# Altium footprint library TomvanRijn-PCB.PcbLib: 165 footprints (part 10 of 11)
Each footprint in its own frame and in the unit in brackets; x right, y up, seen from the top. Pads: shape width x height; smd on the part's side, far side on the other; paste and mask are expansions set on the pad; w line width, h text height; cw(c..) or ccw(c..) is an arc to the next point about the centre after c.
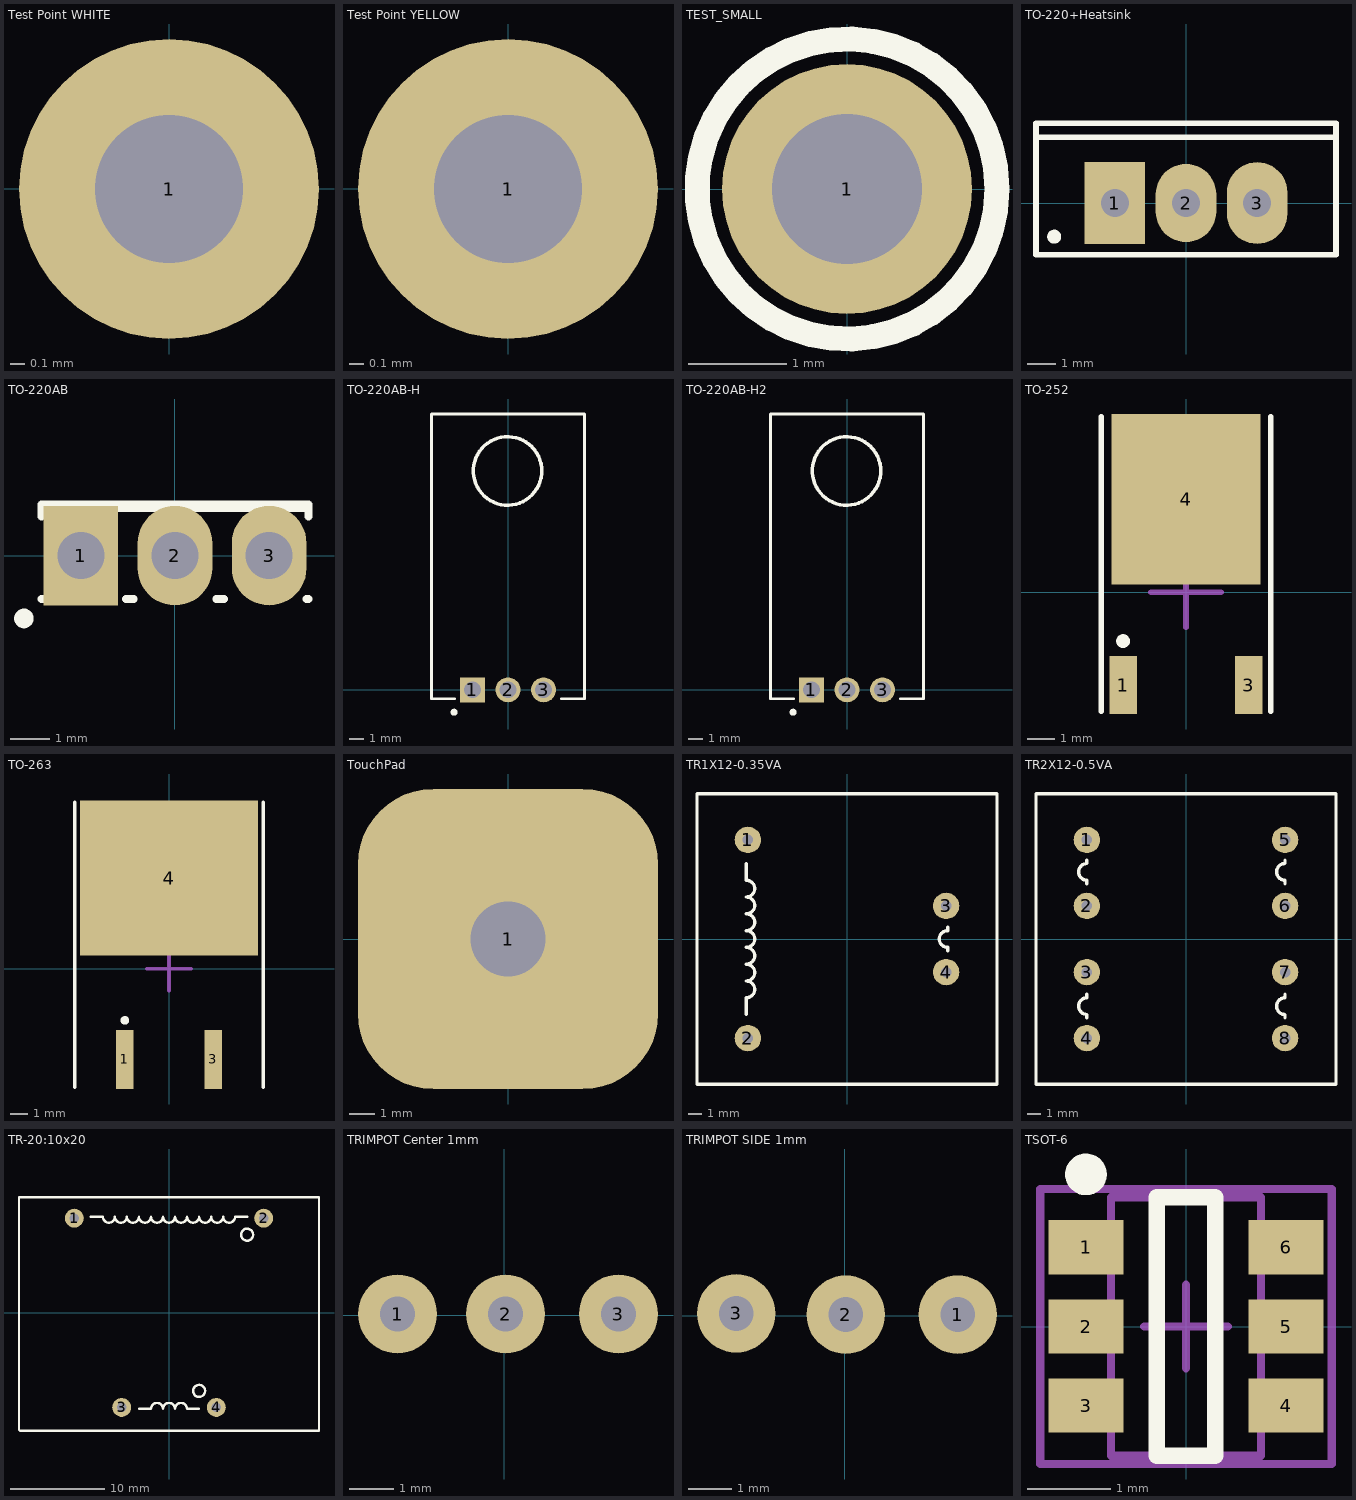
[diagram p9: the footprints below, top view; thin cyan lines are the x and y axes]

## Test Point WHITE [mil] "Test Point Keystone WHITE 5002"
pads (1):
  round 80 hole 39.37: 1(0,0)
3D body "User Library-TEST POINT WHT Keystone 5002.step": height 192.34, standoff -121.02, extent -50,-50 50,50

## Test Point YELLOW [mil] "Test Point Keystone YELLOW 5004"
pads (1):
  round 80 hole 39.37: 1(0,0)
3D body "User Library-TEST POINT YEL Keystone 5004.step": height 192.34, standoff -121.02, extent -50,-50 50,50

## TEST_SMALL [mil] "Test Point"
pads (1):
  round 100 hole 60: 1(0,0)
Top Overlay:
  circle w10: c0,0 r60

## TO-220+Heatsink [mil] "TO, Thru-Hole, Vertical, Heatsink Mounted; 3 In-Line Leads; Pitch 2.54 mm"
height 759.84
pads (3):
  rect 85x115 hole 39.37: 1(-100,0)
  oval 85x110 hole 39.37: 2(0,0)
  oval 85x115 hole 39.37: 3(100,0)
Top Overlay:
  circle w9.84: c-185.04,-47.24 r4.92
  lines w7.87: -210.63,92.52 210.63,92.52 ; -210.63,-72.83 -210.63,112.2 210.63,112.2 210.63,-72.83 -210.63,-72.83
Mechanical 13:
  lines w3.94: -210.63,-72.83 210.63,-72.83 210.63,112.2 -210.63,112.2 -210.63,-72.83
Mechanical 15:
  lines w3.94: -19.69,0 19.68,0 ; 0,-19.69 0,19.68
3D body "User Library-TO3B_(TO220)_1.step": height 948.03, standoff -170.08, extent -204.72,-67.16 204.72,110
3D body "User Library-heatsink-2.STEP": height 1075, standoff -66.73, extent -492.12,-135.28 492.13,455.27

## TO-220AB [mm] "TO-220AB, 3 leads, 2.40 mm pitch"
height 9.7
pads (3):
  rect 1.905x2.54 hole 1.2: 1(-2.4,0)
  oval 1.905x2.54 hole 1.2: 2(0,0) 3(2.4,0)
Top Overlay:
  circle w0.25: c-3.85,-1.6 r0.125
  lines w0.2: -3.4,-1.1 -3.35,-1.1 ; -3.4,1 -3.4,1.3 3.4,1.3 3.4,1 ; -3.4,1.21 3.4,1.21 ; -1.25,-1.1 -1.05,-1.1 ; 1.05,-1.1 1.25,-1.1 ; 3.35,-1.1 3.4,-1.1
Mechanical 15:
  lines w0.1: -0.5,0 0.5,0 ; 0,-0.5 0,0.5
3D body "TO-220AB.step": height 19.33, standoff -10, extent -5.466,-1.495 5.747,3.195

## TO-220AB-H [mil] "TO-220AB, 3 leads, 100 mil pitch, horizontal"
height 157.48
pads (3):
  rect 70x70 hole 47.24: 1(-100,0)
  round 70 hole 47.24: 2(0,0) 3(100,0)
Top Overlay:
  circle w9.84: c-151.57,-62.99 r4.92
  circle w10: c-1.18,615 r96.18
  lines w8: -150,-25 -215,-25 -215,775 215,775 215,-25 150,-25
Mechanical 15:
  lines w3.94: -19.69,0 19.68,0 ; 0,-19.68 0,19.69
3D body "TO-220-H.step": height 165.35, standoff -118.11, extent -199.99,-9.84 200.01,757.49

## TO-220AB-H2 [mil] "TO-220AB, 3 leads, 100 mil pitch, horizontal"
height 354.33
pads (3):
  rect 70x70 hole 47.24: 1(-100,0)
  round 70 hole 47.24: 2(0,0) 3(100,0)
Top Overlay:
  circle w10: c-1.18,615 r96.18
  circle w9.84: c-151.57,-62.99 r4.92
  lines w8: -150,-25 -215,-25 -215,775 215,775 215,-25 150,-25
Mechanical 15:
  lines w3.94: -19.69,0 19.68,0 ; 0,-19.68 0,19.69
3D body: height 196.85, standoff -118.11, extent 88.29,-11.78 111.82,11.8
3D body: height 196.85, standoff -118.11, extent -11.71,-11.78 11.82,11.8
3D body: height 196.85, standoff -118.11, extent -111.71,-11.79 -88.18,11.79
3D body "TO-220-H.step": height 342.52, standoff 59.06, extent -199.99,-9.84 200.01,757.49

## TO-252 [mm] "D-PAK/TO-252-AA; 3 Leads (1 Cropped); Body 10.1 (inc. leads) x 6.6 mm (LxW max)"
height 2.4
pads (3):
  rect 1x2.1 smd: 1(-2.285,-3.375) 3(2.285,-3.375)
  rect 5.4x6.2 smd: 4(0,3.375)
Top Overlay:
  circle w0.25: c-2.285,-1.775 r0.125
  lines w0.2: -3.085,-4.325 -3.085,6.375 ; 3.085,-4.325 3.085,6.375
Mechanical 15:
  lines w0.203: -1.27,0 1.27,0 ; 0,-1.27 0,1.27
3D body "TO-252.step": height 2.29, standoff -0.13, extent -3.27,-4.033 3.27,5.906

## TO-263 [mm] "D2-PAK/TO-263-AB; 3 Leads (1 Cropped); Body 15.9 (inc. leads) x 10.4 mm (LxW max)"
height 4.6
pads (3):
  rect 1x3.4 smd: 1(-2.54,-5.225) 3(2.54,-5.225)
  rect 10.25x8.9 smd: 4(0,5.225)
Top Overlay:
  circle w0.25: c-2.54,-2.975 r0.125
  lines w0.2: -5.425,-6.825 -5.425,9.575 ; 5.425,-6.825 5.425,9.575
Mechanical 15:
  lines w0.203: -1.27,0 1.27,0 ; 0,-1.27 0,1.27
3D body "TO-263.step": height 4.78, standoff -0.23, extent -5.08,-6.241 5.08,9.023

## TouchPad [mm] "Touch pad"
pads (2):
  rrect50% 12x12 smd paste-1000: 1(0,0)
  rect 0x0 hole 3: 13(0,0)

## TR1X12-0.35VA [mm] "Transformer 230V 1x12V 0.35VA primary pitch 15 mm, secondary pitch 5mm, spacing 15mm"
height 15
pads (4):
  round 2 hole 0.8: 1(-7.5,7.5) 2(-7.5,-7.5) 3(7.5,2.5) 4(7.5,-2.5)
Top Overlay:
  lines w0.254: -7.62,-5.715 -7.62,-4.445 ccw(c-7.62,-3.81) -7.62,-3.175 ccw(c-7.62,-2.54) -7.62,-1.905 ccw(c-7.62,-1.27) -7.62,-0.635 ccw(c-7.62,0) -7.62,0.635 ccw(c-7.62,1.27) -7.62,1.905 ccw(c-7.62,2.54) -7.62,3.175 ccw(c-7.62,3.81) -7.62,4.445 -7.62,5.715 ; 7.62,-0.889 7.62,-0.635 cw(c7.62,0) 7.62,0.635 7.62,0.889 ; -11.35,-11 11.35,-11 11.35,11 -11.35,11 -11.35,-11
3D body: height 2.08, standoff -3, extent 7.203,-2.799 7.8,-2.2
3D body: height 2.08, standoff -3, extent 7.202,2.201 7.8,2.8
3D body: height 2.08, standoff -3, extent -7.798,7.201 -7.2,7.8
3D body: height 2.08, standoff -3, extent -7.798,-7.799 -7.2,-7.2
3D body: height 11.5, standoff 0, extent -11.477,-11.127 11.477,11.127
3D body: height 15, standoff 0, extent -7.5,-7.5 7.493,7.5

## TR2X12-0.5VA [mm] "Transformer 230V 2x12V 0.5VA primary pitch 15 mm, secondary pitch 5mm, spacing 15mm"
height 19
pads (8):
  round 2 hole 0.8: 1(-7.5,7.5) 2(-7.5,2.5) 3(-7.5,-2.5) 4(-7.5,-7.5) 5(7.5,7.5) 6(7.5,2.5) 7(7.5,-2.5) 8(7.5,-7.5)
Top Overlay:
  lines w0.254: -7.5,-5.969 -7.5,-5.715 cw(c-7.493,-5.08) -7.5,-4.445 -7.5,-4.191 ; -7.5,4.191 -7.5,4.445 cw(c-7.493,5.08) -7.5,5.715 -7.5,5.962 ; 7.493,-5.969 7.493,-5.715 cw(c7.493,-5.08) 7.493,-4.445 7.493,-4.191 ; 7.493,4.191 7.493,4.445 cw(c7.493,5.08) 7.493,5.715 7.493,5.969 ; -11.35,-11 11.35,-11 11.35,11 -11.35,11 -11.35,-11
3D body: height 2.08, standoff -3, extent 7.203,7.201 7.8,7.8
3D body: height 2.08, standoff -3, extent 7.202,2.201 7.8,2.8
3D body: height 2.08, standoff -3, extent -7.798,7.201 -7.2,7.8
3D body: height 2.08, standoff -3, extent -7.798,-7.799 -7.2,-7.2
3D body: height 15, standoff 0, extent -11.477,-11.127 11.477,11.127
3D body: height 19, standoff 0, extent -7.5,-7.5 7.5,7.5
3D body: height 2.08, standoff -3, extent 7.202,-2.799 7.8,-2.2
3D body: height 2.08, standoff -3, extent 7.203,-7.799 7.8,-7.2
3D body: height 2.08, standoff -3, extent -7.797,2.201 -7.2,2.8
3D body: height 2.08, standoff -3, extent -7.797,-2.799 -7.2,-2.2

## TR-20:10x20 [mm] "Transformer, body 31.7 x 26.7 x 21.8 mm, prim leads 20 mm; sec leads 10 mm; 20 mm spacing"
height 32.8
pads (4):
  round 2 hole 1: 1(-10,10) 2(10,10) 3(-5,-10) 4(5,-10)
Top Overlay:
  circle w0.254: c8.255,8.255 r0.635
  circle w0.254: c3.175,-8.255 r0.635
  lines w0.254: -15.85,-12.344 -15.85,12.192 15.85,12.192 15.85,-12.446 ; -15.748,-12.446 15.748,-12.446 ; -8.255,10.16 -6.985,10.16 ccw(c-6.35,10.16) -5.715,10.16 ccw(c-5.08,10.16) -4.445,10.16 ccw(c-3.81,10.16) -3.175,10.16 ccw(c-2.54,10.16) -1.905,10.16 ccw(c-1.27,10.16) -0.635,10.16 ccw(c0,10.16) 0.635,10.16 ccw(c1.27,10.16) 1.905,10.16 ccw(c2.54,10.16) 3.175,10.16 ccw(c3.81,10.16) 4.445,10.16 ccw(c5.08,10.16) 5.715,10.16 ccw(c6.35,10.16) 6.985,10.16 8.255,10.16 ; -3.175,-10.16 -1.905,-10.16 cw(c-1.27,-10.16) -0.635,-10.16 cw(c0,-10.16) 0.635,-10.16 cw(c1.27,-10.16) 1.905,-10.16 3.175,-10.16
3D body "TR.step": height 23.7, standoff -5, extent -16.244,-13.716 16.256,13.784

## TRIMPOT Center 1mm [mm] "Bourns Trimpot 3296W"
height 0.255
pads (3):
  round 1.8 hole 0.8: 1(-2.435,0.025) 2(0.025,0.025) 3(2.599,0.025)
3D body "User Library-3296W.STEP": height 11.55, standoff -1.6, extent -4.739,-2.374 4.791,2.426

## TRIMPOT SIDE 1mm [mm] "Bourns Trimpot 3296W"
height 0.255
pads (3):
  round 1.8 hole 0.8: 1(2.599,0.025) 2(0.025,0.025) 3(-2.489,0.051)
3D body "User Library-Bourns_3299W.step": height 11.56, standoff -1.14, extent -4.737,-4.165 4.788,1.931

## TSOT-6 [mm] "SOT23, 6-Leads, Body 2.9x1.6mm, Pitch 0.95mm, Lead Span 2.8mm, IPC High Density"
height 1.1
pads (6):
  rect 0.9x0.65 smd: 1(-1.2,0.95) 2(-1.2,0) 3(-1.2,-0.95) 4(1.2,-0.95) 5(1.2,0) 6(1.2,0.95)
Top Overlay:
  circle w0.25: c-1.2,1.825 r0.125
  lines w0.2: -0.35,-1.55 0.35,-1.55 0.35,1.55 -0.35,1.55 -0.35,-1.55
Mechanical 13:
  lines w0.1: -0.9,-1.55 -0.9,1.55 0.9,1.55 0.9,-1.55 -0.9,-1.55
Mechanical 15:
  lines w0.1: -0.5,0 0.5,0 ; 0,-0.5 0,0.5 ; -1.75,-1.65 -1.75,1.65 1.75,1.65 1.75,-1.65 -1.75,-1.65
3D body "User Library-TSOT-23.step": height 0.86, standoff 0, extent -1.405,-1.5 1.405,1.5